# Altium footprint library 6-Connectors-6.PcbLib: 117 footprints (part 4 of 8)
Each footprint in its own frame and in the unit in brackets; x right, y up, seen from the top. Pads: shape width x height; smd on the part's side, far side on the other; paste and mask are expansions set on the pad; w line width, h text height; cw(c..) or ccw(c..) is an arc to the next point about the centre after c.
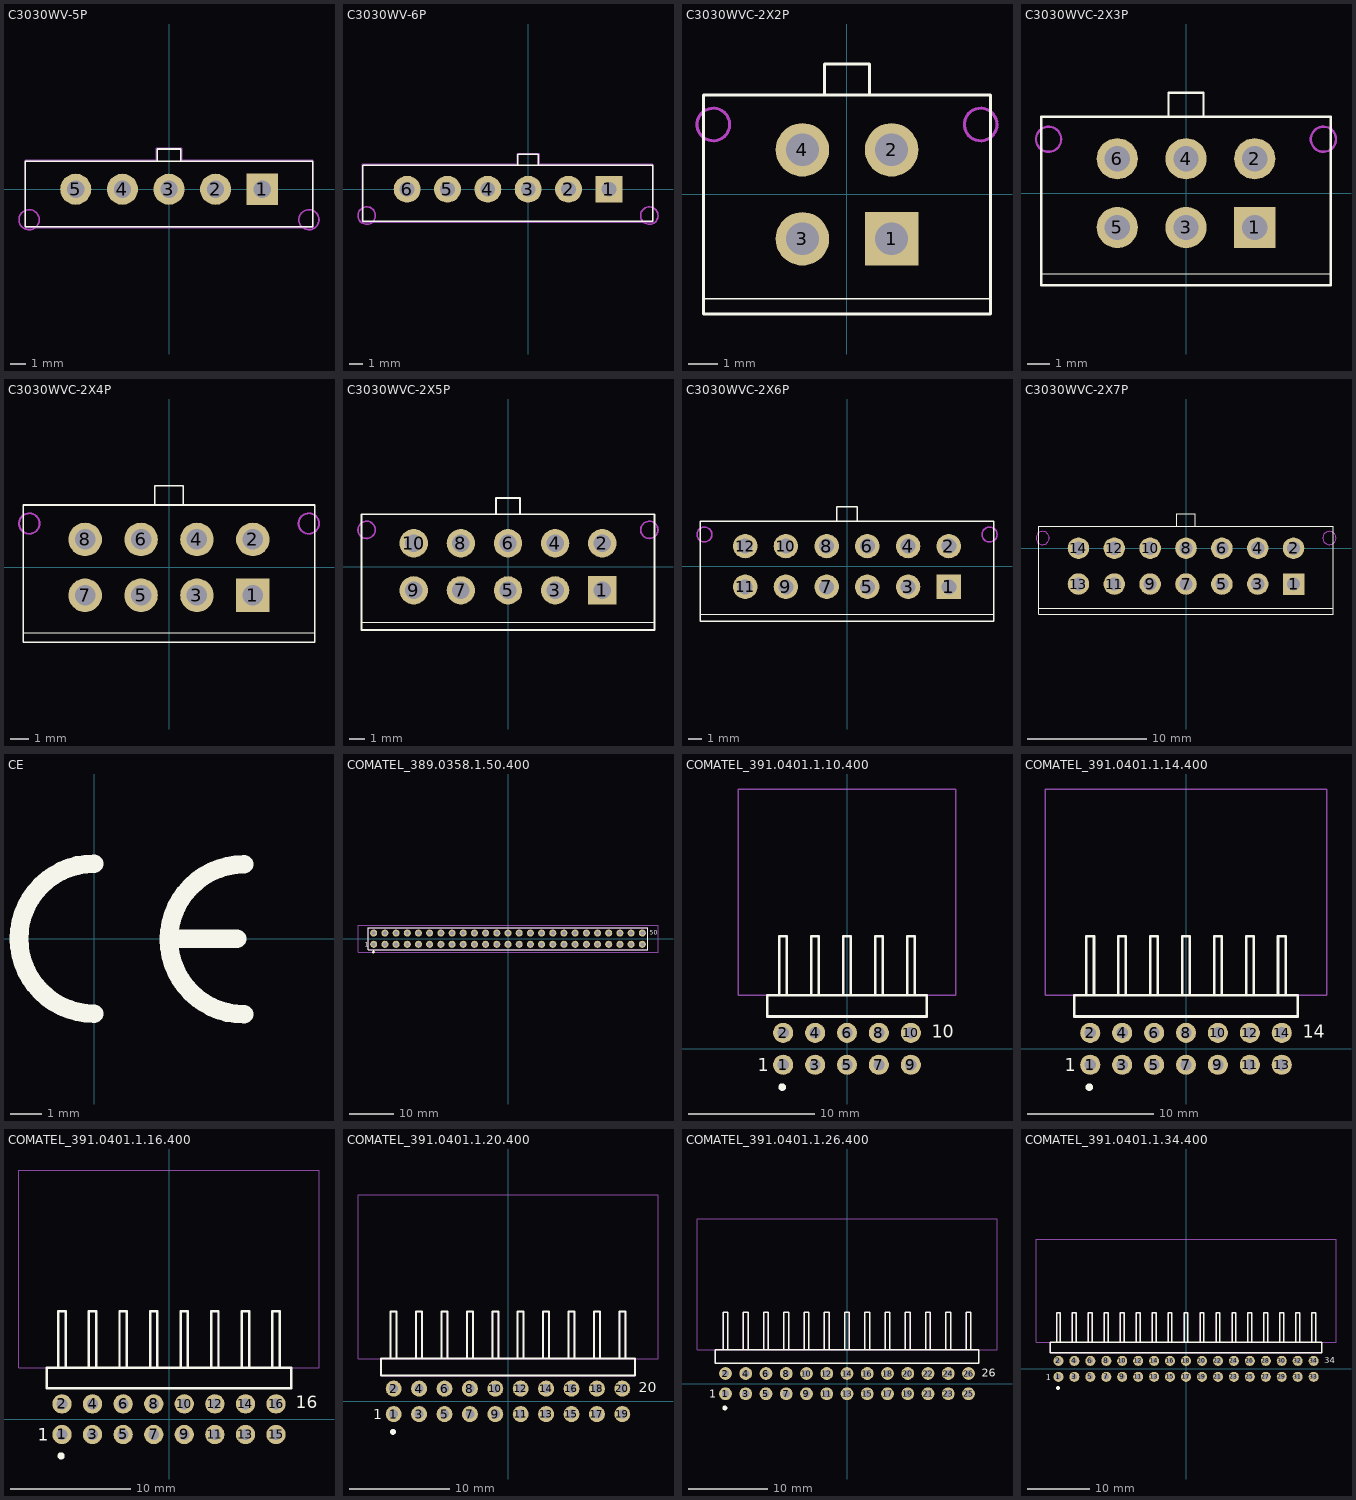
[diagram p3: the footprints below, top view; thin cyan lines are the x and y axes]

## C3030WV-5P [mm]
height 14.6
pads (5):
  rect 2x2 hole 1.1: 1(6,0)
  round 2 hole 1.1: 2(3,0) 3(0,0) 4(-3,0) 5(-6,0)
Top Overlay:
  lines w0.1: -0.762,1.79 -0.762,2.591 0.762,2.591 0.762,1.79 ; -9.25,-2.4 -9.25,1.79 9.25,1.79 9.25,-2.4 -9.25,-2.4
Keep-Out Layer:
  circle w0.1: c-9,-1.96 r0.65
  circle w0.1: c9,-1.96 r0.65
Mechanical 1:
  circle w0.1: c-9,-1.96 r0.65
  circle w0.1: c9,-1.96 r0.65
Mechanical 11:
  lines w0.1: -9.25,-2.464 9.25,-2.464 9.25,1.854 0.813,1.854 0.813,2.642 -0.813,2.642 -0.813,1.854 -9.25,1.854 -9.25,-2.464
3D body "2-2-1f.stp": height 0.35, standoff -1.85, extent 5,-1 7,1
3D body "2-2-1f.stp": height 0.35, standoff -1.85, extent 2,-1 4,1
3D body "2-2_1.stp": height 0.35, standoff -1.85, extent -1,-0.999 1,0.999
3D body "2-2_1.stp": height 0.35, standoff -1.85, extent -4,-0.999 -2,0.999
3D body "2-2_1.stp": height 0.35, standoff -1.85, extent -7,-0.999 -5,0.999
3D body "c3030wv-5p.stp": height 9.9, standoff -3, extent -9.35,-2.566 9.3,2.804

## C3030WV-6P [mm]
height 14.6
pads (6):
  rect 2x2 hole 1.1: 1(6,0)
  round 2 hole 1.1: 2(3,0) 3(0,0) 4(-3,0) 5(-6,0) 6(-9,0)
Top Overlay:
  lines w0.1: -0.762,1.79 -0.762,2.591 0.762,2.591 0.762,1.79 ; -12.294,-2.4 9.25,-2.4 9.25,1.79 -12.294,1.79 -12.294,-2.4
Keep-Out Layer:
  circle w0.1: c9,-1.96 r0.65
  circle w0.1: c-12,-1.96 r0.65
Mechanical 1:
  circle w0.1: c9,-1.96 r0.65
  circle w0.1: c-12,-1.96 r0.65
Mechanical 11:
  lines w0.1: -12.319,-2.464 -12.319,1.854 -0.813,1.854 -0.813,2.642 0.813,2.642 0.813,1.854 9.25,1.854 9.25,-2.464 -12.319,-2.464
3D body "2-2_1.stp": height 0.05, standoff -2.15, extent -9.98,-0.923 -7.98,1.075
3D body "2-2_1.stp": height 0.05, standoff -2.15, extent 5,-0.999 7,0.999
3D body "2-2_1.stp": height 0.05, standoff -2.15, extent -7,-0.999 -5,0.999
3D body "2-2_1.stp": height 0.05, standoff -2.15, extent -4,-0.999 -2,0.999
3D body "2-2_1.stp": height 0.05, standoff -2.15, extent -1,-0.999 1,0.999
3D body "2-2-1f.stp": height 0.05, standoff -2.15, extent 2,-1 4,1

## C3030WVC-2X2P [mm]
height 14.6
pads (4):
  rect 1.8x1.8 hole 1.1: 1(1.5,-1.5)
  round 1.8 hole 1.1: 2(1.5,1.5) 3(-1.5,-1.5) 4(-1.5,1.5)
Top Overlay:
  lines w0.05: -4.825,-3.513 4.825,-3.513
  lines w0.1: -0.762,3.337 -0.762,4.382 0.762,4.382 0.762,3.366 ; -4.825,-4.023 -4.825,-3.513 -4.825,3.337 4.825,3.337 4.825,-3.513 4.825,-4.023 -4.825,-4.023
Keep-Out Layer:
  circle w0.1: c-4.5,2.352 r0.55
  circle w0.1: c4.5,2.352 r0.55
Mechanical 1:
  circle w0.1: c-4.5,2.352 r0.55
  circle w0.1: c4.5,2.352 r0.55
3D body "c3030wv-2x2p.stp": height 9.9, standoff -3, extent -4.876,-3.985 4.774,3.375

## C3030WVC-2X3P [mm]
height 14.6
pads (6):
  rect 1.8x1.8 hole 1.1: 1(3,-1.5)
  round 1.8 hole 1.1: 2(3,1.5) 3(0,-1.5) 4(0,1.5) 5(-3,-1.5) 6(-3,1.5)
Top Overlay:
  lines w0.05: -6.325,-3.513 6.325,-3.513
  lines w0.1: -0.762,3.337 -0.762,4.382 0.762,4.382 0.762,3.366 ; -6.325,-4.023 -6.325,-3.513 -6.325,3.337 6.325,3.337 6.325,-3.513 6.325,-4.023 -6.325,-4.023
Keep-Out Layer:
  circle w0.1: c-6,2.352 r0.55
  circle w0.1: c6,2.352 r0.55
Mechanical 1:
  circle w0.1: c-6,2.352 r0.55
  circle w0.1: c6,2.352 r0.55
3D body "2-2-1f.stp": height 0.35, standoff -1.85, extent -4,-2.5 -2,-0.5
3D body "c3030wv-2x3p.stp": height 9.9, standoff -3, extent -6.325,-4.061 6.325,4.299
3D body "2-2_1.stp": height 0.35, standoff -1.85, extent -4,0.501 -2,2.499
3D body "2-2_1.stp": height 0.35, standoff -1.85, extent -1,0.501 1,2.499
3D body "2-2_1.stp": height 0.35, standoff -1.85, extent 2,0.501 4,2.499
3D body "2-2_1.stp": height 0.35, standoff -1.85, extent -1,-2.499 1,-0.501
3D body "2-2_1.stp": height 0.35, standoff -1.85, extent 2,-2.499 4,-0.501

## C3030WVC-2X4P [mm]
height 14.6
pads (8):
  rect 1.8x1.8 hole 1.1: 1(4.5,-1.5)
  round 1.8 hole 1.1: 2(4.5,1.5) 3(1.5,-1.5) 4(1.5,1.5) 5(-1.5,-1.5) 6(-1.5,1.5) 7(-4.5,-1.5) 8(-4.5,1.5)
Top Overlay:
  lines w0.05: -7.825,-3.513 7.825,-3.513
  lines w0.1: -0.762,3.337 -0.762,4.382 0.762,4.382 0.762,3.366 ; -7.825,-4.023 -7.825,-3.513 -7.825,3.337 7.825,3.337 7.825,-3.513 7.825,-4.023 -7.825,-4.023
Keep-Out Layer:
  circle w0.1: c-7.5,2.352 r0.55
  circle w0.1: c7.5,2.352 r0.55
Mechanical 1:
  circle w0.1: c-7.5,2.352 r0.55
  circle w0.1: c7.5,2.352 r0.55

## C3030WVC-2X5P [mm]
height 14.6
pads (10):
  rect 1.8x1.8 hole 1.1: 1(6,-1.5)
  round 1.8 hole 1.1: 2(6,1.5) 3(3,-1.5) 4(3,1.5) 5(0,-1.5) 6(0,1.5) 7(-3,-1.5) 8(-3,1.5) 9(-6,-1.5) 10(-6,1.5)
Top Overlay:
  lines w0.05: -9.325,-3.513 9.325,-3.513
  lines w0.1: -0.762,3.337 -0.762,4.382 0.762,4.382 0.762,3.366 ; -9.325,-4.023 -9.325,-3.513 -9.325,3.337 9.325,3.337 9.325,-3.513 9.325,-4.023 -9.325,-4.023
Keep-Out Layer:
  circle w0.1: c-9,2.352 r0.55
  circle w0.1: c9,2.352 r0.55
Mechanical 1:
  circle w0.1: c-9,2.352 r0.55
  circle w0.1: c9,2.352 r0.55
3D body "c3030wv-2x5p.stp": height 9.9, standoff -3, extent -9.329,-3.985 9.329,4.375
3D body "2-2_1.stp": height 0.35, standoff -1.85, extent -7,0.501 -5,2.499
3D body "2-2_1.stp": height 0.35, standoff -1.85, extent -4,0.501 -2,2.499
3D body "2-2_1.stp": height 0.35, standoff -1.85, extent -4,-2.499 -2,-0.501
3D body "2-2_1.stp": height 0.35, standoff -1.85, extent -1,0.501 1,2.499
3D body "2-2_1.stp": height 0.35, standoff -1.85, extent -1,-2.499 1,-0.501
3D body "2-2_1.stp": height 0.35, standoff -1.85, extent 2,-2.499 4,-0.501
3D body "2-2_1.stp": height 0.35, standoff -1.85, extent 5,-2.499 7,-0.501
3D body "2-2_1.stp": height 0.35, standoff -1.85, extent 5,0.501 7,2.499
3D body "2-2_1.stp": height 0.35, standoff -1.85, extent 2,0.501 4,2.499
3D body "2-2-1f.stp": height 0.35, standoff -1.85, extent -7,-2.5 -5,-0.5

## C3030WVC-2X6P [mm]
height 14.6
pads (12):
  rect 1.8x1.8 hole 1.1: 1(7.5,-1.5)
  round 1.8 hole 1.1: 2(7.5,1.5) 3(4.5,-1.5) 4(4.5,1.5) 5(1.5,-1.5) 6(1.5,1.5) 7(-1.5,-1.5) 8(-1.5,1.5) 9(-4.5,-1.5) 10(-4.5,1.5) 11(-7.5,-1.5) 12(-7.5,1.5)
Top Overlay:
  lines w0.05: -10.825,-3.513 10.825,-3.513
  lines w0.1: -0.762,3.337 -0.762,4.382 0.762,4.382 0.762,3.366 ; -10.825,-4.023 10.825,-4.023 10.825,-3.513 10.825,3.337 -10.825,3.337 -10.825,-3.513 -10.825,-4.023
Keep-Out Layer:
  circle w0.1: c10.5,2.352 r0.55
  circle w0.1: c-10.5,2.352 r0.55
Mechanical 1:
  circle w0.1: c10.5,2.352 r0.55
  circle w0.1: c-10.5,2.352 r0.55

## C3030WVC-2X7P [mm]
height 14.6
pads (14):
  rect 1.8x1.8 hole 1.1: 1(9,-3)
  round 1.8 hole 1.1: 2(9,0) 3(6,-3) 4(6,0) 5(3,-3) 6(3,0) 7(0,-3) 8(0,0) 9(-3,-3) 10(-3,0) 11(-6,-3) 12(-6,0) 13(-9,-3) 14(-9,0)
Top Overlay:
  lines w0.05: -12.325,-5.013 12.325,-5.013
  lines w0.1: -0.762,1.837 -0.762,2.882 0.762,2.882 0.762,1.866 ; -12.325,-5.523 -12.325,-5.013 -12.325,1.837 12.325,1.837 12.325,-5.013 12.325,-5.523 -12.325,-5.523
Keep-Out Layer:
  circle w0.1: c-12,0.852 r0.55
  circle w0.1: c12,0.852 r0.55
Mechanical 1:
  circle w0.1: c-12,0.852 r0.55
  circle w0.1: c12,0.852 r0.55

## CE [mm]
Top Overlay:
  lines w0.6: 0,-2.413 cw(c0,0) 0,2.413 ; 2.53,0 4.6,0 ; 4.826,-2.438 cw(c4.826,-0.025) 4.826,2.388
3D body "ce.stp": height 0.02, standoff 0, extent -2.725,-2.725 4.82,2.725

## COMATEL_389.0358.1.50.400 [mm] "50 Contacts - Pitch 2.54mm - Dual Row Straight Strip Header - Insulator 1.7mm"
height 8
pads (50):
  round 1.6 hole 0.9: 1(-30.48,-1.27) 2(-30.48,1.27) 3(-27.94,-1.27) 4(-27.94,1.27) 5(-25.4,-1.27) 6(-25.4,1.27) 7(-22.86,-1.27) 8(-22.86,1.27) 9(-20.32,-1.27) 10(-20.32,1.27) 11(-17.78,-1.27) 12(-17.78,1.27) 13(-15.24,-1.27) 14(-15.24,1.27) 15(-12.7,-1.27) 16(-12.7,1.27) 17(-10.16,-1.27) 18(-10.16,1.27) 19(-7.62,-1.27) 20(-7.62,1.27) 21(-5.08,-1.27) 22(-5.08,1.27) 23(-2.54,-1.27) 24(-2.54,1.27) 25(0,-1.27) 26(0,1.27) 27(2.54,-1.27) 28(2.54,1.27) 29(5.08,-1.27) 30(5.08,1.27) 31(7.62,-1.27) 32(7.62,1.27) 33(10.16,-1.27) 34(10.16,1.27) 35(12.7,-1.27) 36(12.7,1.27) 37(15.24,-1.27) 38(15.24,1.27) 39(17.78,-1.27) 40(17.78,1.27) 41(20.32,-1.27) 42(20.32,1.27) 43(22.86,-1.27) 44(22.86,1.27) 45(25.4,-1.27) 46(25.4,1.27) 47(27.94,-1.27) 48(27.94,1.27) 49(30.48,-1.27) 50(30.48,1.27)
Top Overlay:
  circle w0.3: c-30.553,-3.048 r0.15
  lines w0.2: -31.75,-2.5 -31.75,2.5 31.75,2.5 31.75,-2.5 -31.75,-2.5
  text "50" at 32.131,0.889 h1.02
  text "1" at -32.512,-1.778 h1.02
Mechanical 8:
  lines w0.1: -34.04,-3.05 -34.04,3.05 34.04,3.05 34.04,-3.05 -34.04,-3.05
Mechanical 14:
  lines w0.1: 31.75,-2.5 31.75,2.5 ; 31.75,-2.5 -31.75,-2.5 -31.75,2.5 31.75,2.5 ; 31.75,-2.5 31.75,2.5
3D body "COMATEL_389.0358.1.50.400.stp": height 8, standoff -3.2, extent -31.75,-3 31.75,2.5

## COMATEL_391.0401.1.10.400 [mm] "10 Contacts - Pitch 2.54mm - Dual Row Right Angle Strip Header - Insulator 1.7mm"
height 8
pads (10):
  round 1.6 hole 0.9: 1(-5.08,-1.27) 2(-5.08,1.27) 3(-2.54,-1.27) 4(-2.54,1.27) 5(0,-1.27) 6(0,1.27) 7(2.54,-1.27) 8(2.54,1.27) 9(5.08,-1.27) 10(5.08,1.27)
Top Overlay:
  circle w0.3: c-5.153,-3.048 r0.15
  lines w0.2: -6.35,2.57 -6.35,4.27 6.35,4.27 6.35,2.57 -6.35,2.57 ; -5.38,4.27 -4.78,4.27 -4.78,8.97 -5.38,8.97 -5.38,4.27 ; -2.84,4.27 -2.84,8.97 -2.24,8.97 -2.24,4.27 -2.84,4.27 ; -0.3,4.27 -0.3,8.97 0.3,8.97 0.3,4.27 -0.3,4.27 ; 2.24,4.27 2.24,8.97 2.84,8.97 2.84,4.27 2.24,4.27 ; 4.78,4.27 4.78,8.97 5.38,8.97 5.38,4.27 4.78,4.27
  text "1" at -7.112,-1.778 h1.02
  text "10" at 6.731,0.889 h1.02
Mechanical 8:
  lines w0.1: -8.65,4.27 8.65,4.27 8.65,20.67 -8.65,20.67 -8.65,4.27
Mechanical 14:
  lines w0.1: -6.35,2.57 6.35,2.57 6.35,4.27 -6.35,4.27 -6.35,2.57 ; -5.38,4.27 -4.78,4.27 -4.78,8.97 -5.38,8.97 -5.38,4.27 ; -2.84,4.27 -2.84,8.97 -2.24,8.97 -2.24,4.27 -2.84,4.27 ; -0.3,4.27 -0.3,8.97 0.3,8.97 0.3,4.27 -0.3,4.27 ; 2.24,4.27 2.24,8.97 2.84,8.97 2.84,4.27 2.24,4.27 ; 4.78,4.27 4.78,8.97 5.38,8.97 5.38,4.27 4.78,4.27
  text "1" at -7.112,-1.778 h1.02
  text "10" at 6.731,0.889 h1.02
3D body "COMATEL_391.0401.1.10.400.stp": height 5.57, standoff -4.3, extent -6.35,-1.57 6.35,10.27
3D body "v160-090.stp": height 0.02, standoff -1.65, extent -5.88,-2.07 -4.28,-0.47
3D body "v160-090.stp": height 0.02, standoff -1.65, extent -5.88,0.47 -4.28,2.07
3D body "v160-090.stp": height 0.02, standoff -1.65, extent -3.34,0.47 -1.74,2.07
3D body "v160-090.stp": height 0.02, standoff -1.65, extent -3.34,-2.07 -1.74,-0.47
3D body "v160-090.stp": height 0.02, standoff -1.65, extent -0.8,-2.07 0.8,-0.47
3D body "v160-090.stp": height 0.02, standoff -1.65, extent -0.8,0.47 0.8,2.07
3D body "v160-090.stp": height 0.02, standoff -1.65, extent 1.74,-2.07 3.34,-0.47
3D body "v160-090.stp": height 0.02, standoff -1.65, extent 1.74,0.47 3.34,2.07
3D body "v160-090.stp": height 0.02, standoff -1.65, extent 4.28,0.47 5.88,2.07
3D body "v160-090.stp": height 0.02, standoff -1.65, extent 4.28,-2.07 5.88,-0.47

## COMATEL_391.0401.1.14.400 [mm] "14 Contacts - Pitch 2.54mm - Dual Row Right Angle Strip Header - Insulator 1.7mm"
height 8
pads (14):
  round 1.6 hole 0.9: 1(-7.62,-1.27) 2(-7.62,1.27) 3(-5.08,-1.27) 4(-5.08,1.27) 5(-2.54,-1.27) 6(-2.54,1.27) 7(0,-1.27) 8(0,1.27) 9(2.54,-1.27) 10(2.54,1.27) 11(5.08,-1.27) 12(5.08,1.27) 13(7.62,-1.27) 14(7.62,1.27)
Top Overlay:
  circle w0.3: c-7.693,-3.048 r0.15
  lines w0.2: -7.92,4.27 -7.32,4.27 ; -7.92,4.27 -7.92,8.97 -7.32,8.97 -7.32,4.27 ; -7.92,4.27 -7.32,4.27 ; -5.38,4.27 -4.78,4.27 ; -5.38,4.27 -5.38,8.97 -4.78,8.97 -4.78,4.27 ; -5.38,4.27 -4.78,4.27 ; -2.84,4.27 -2.24,4.27 ; -2.84,4.27 -2.84,8.97 -2.24,8.97 -2.24,4.27 ; -2.84,4.27 -2.24,4.27 ; -0.3,4.27 0.3,4.27 ; -0.3,4.27 -0.3,8.97 0.3,8.97 0.3,4.27 ; -0.3,4.27 0.3,4.27 ; 2.24,4.27 2.84,4.27 ; 2.24,4.27 2.24,8.97 2.84,8.97 2.84,4.27 ; 2.24,4.27 2.84,4.27 ; -8.89,2.57 8.89,2.57 8.89,4.27 -8.89,4.27 -8.89,2.57 ; 4.78,4.27 4.78,8.97 5.38,8.97 5.38,4.27 4.78,4.27 ; 7.32,4.27 7.32,8.97 7.92,8.97 7.92,4.27 7.32,4.27
  text "14" at 9.271,0.889 h1.02
  text "1" at -9.652,-1.778 h1.02
Mechanical 8:
  lines w0.1: -11.19,4.27 -11.19,20.67 11.19,20.67 11.19,4.27 -11.19,4.27
Mechanical 14:
  lines w0.1: -7.92,4.27 -7.32,4.27 ; -7.92,4.27 -7.92,8.97 -7.32,8.97 -7.32,4.27 ; -7.92,4.27 -7.32,4.27 ; -5.38,4.27 -4.78,4.27 ; -5.38,4.27 -5.38,8.97 -4.78,8.97 -4.78,4.27 ; -5.38,4.27 -4.78,4.27 ; -2.84,4.27 -2.24,4.27 ; -2.84,4.27 -2.84,8.97 -2.24,8.97 -2.24,4.27 ; -2.84,4.27 -2.24,4.27 ; -0.3,4.27 0.3,4.27 ; -0.3,4.27 -0.3,8.97 0.3,8.97 0.3,4.27 ; -0.3,4.27 0.3,4.27 ; 2.24,4.27 2.84,4.27 ; 2.24,4.27 2.24,8.97 2.84,8.97 2.84,4.27 ; 2.24,4.27 2.84,4.27 ; -8.89,2.57 -8.89,4.27 8.89,4.27 8.89,2.57 -8.89,2.57 ; 4.78,4.27 4.78,8.97 5.38,8.97 5.38,4.27 4.78,4.27 ; 7.32,4.27 7.32,8.97 7.92,8.97 7.92,4.27 7.32,4.27
  text "14" at 9.271,0.889 h1.02
  text "1" at -9.652,-1.778 h1.02
3D body "COMATEL_391.0401.1.14.400.stp": height 5.57, standoff -4.3, extent -8.89,-1.57 8.89,10.27
3D body "v160-090.stp": height 0.02, standoff -1.65, extent -8.42,0.47 -6.82,2.07
3D body "v160-090.stp": height 0.02, standoff -1.65, extent -8.42,-2.07 -6.82,-0.47
3D body "v160-090.stp": height 0.02, standoff -1.65, extent -5.88,0.47 -4.28,2.07
3D body "v160-090.stp": height 0.02, standoff -1.65, extent -5.88,-2.07 -4.28,-0.47
3D body "v160-090.stp": height 0.02, standoff -1.65, extent -3.34,0.47 -1.74,2.07
3D body "v160-090.stp": height 0.02, standoff -1.65, extent -3.34,-2.07 -1.74,-0.47
3D body "v160-090.stp": height 0.02, standoff -1.65, extent -0.8,0.47 0.8,2.07
3D body "v160-090.stp": height 0.02, standoff -1.65, extent -0.8,-2.07 0.8,-0.47
3D body "v160-090.stp": height 0.02, standoff -1.65, extent 1.74,0.47 3.34,2.07
3D body "v160-090.stp": height 0.02, standoff -1.65, extent 1.74,-2.07 3.34,-0.47
3D body "v160-090.stp": height 0.02, standoff -1.65, extent 4.28,0.47 5.88,2.07
3D body "v160-090.stp": height 0.02, standoff -1.65, extent 4.28,-2.07 5.88,-0.47
3D body "v160-090.stp": height 0.02, standoff -1.65, extent 6.82,-2.07 8.42,-0.47
3D body "v160-090.stp": height 0.02, standoff -1.65, extent 6.82,0.47 8.42,2.07

## COMATEL_391.0401.1.16.400 [mm] "16 Contacts - Pitch 2.54mm - Dual Row Right Angle Strip Header - Insulator 1.7mm"
height 8
pads (16):
  round 1.6 hole 0.9: 1(-8.89,-1.27) 2(-8.89,1.27) 3(-6.35,-1.27) 4(-6.35,1.27) 5(-3.81,-1.27) 6(-3.81,1.27) 7(-1.27,-1.27) 8(-1.27,1.27) 9(1.27,-1.27) 10(1.27,1.27) 11(3.81,-1.27) 12(3.81,1.27) 13(6.35,-1.27) 14(6.35,1.27) 15(8.89,-1.27) 16(8.89,1.27)
Top Overlay:
  circle w0.3: c-8.963,-3.048 r0.15
  lines w0.2: -9.19,4.27 -8.59,4.27 ; -9.19,4.27 -9.19,8.97 -8.59,8.97 -8.59,4.27 ; -9.19,4.27 -8.59,4.27 ; -6.65,4.27 -6.05,4.27 ; -6.65,4.27 -6.65,8.97 -6.05,8.97 -6.05,4.27 ; -6.65,4.27 -6.05,4.27 ; -4.11,4.27 -3.51,4.27 ; -4.11,4.27 -4.11,8.97 -3.51,8.97 -3.51,4.27 ; -4.11,4.27 -3.51,4.27 ; -1.57,4.27 -0.97,4.27 ; -1.57,4.27 -1.57,8.97 -0.97,8.97 -0.97,4.27 ; -1.57,4.27 -0.97,4.27 ; 0.97,4.27 1.57,4.27 ; 0.97,4.27 0.97,8.97 1.57,8.97 1.57,4.27 ; 0.97,4.27 1.57,4.27 ; -10.16,2.57 -10.16,4.27 10.16,4.27 10.16,2.57 -10.16,2.57 ; 3.51,4.27 4.11,4.27 4.11,8.97 3.51,8.97 3.51,4.27 ; 6.05,4.27 6.65,4.27 6.65,8.97 6.05,8.97 6.05,4.27 ; 8.59,4.27 8.59,8.97 9.19,8.97 9.19,4.27 8.59,4.27
  text "1" at -10.922,-1.778 h1.02
  text "16" at 10.541,0.889 h1.02
Mechanical 8:
  lines w0.1: -12.46,4.27 -12.46,20.67 12.46,20.67 12.46,4.27 -12.46,4.27
Mechanical 14:
  lines w0.1: -9.19,4.27 -8.59,4.27 ; -9.19,4.27 -9.19,8.97 -8.59,8.97 -8.59,4.27 ; -9.19,4.27 -8.59,4.27 ; -6.65,4.27 -6.05,4.27 ; -6.65,4.27 -6.65,8.97 -6.05,8.97 -6.05,4.27 ; -6.65,4.27 -6.05,4.27 ; -4.11,4.27 -3.51,4.27 ; -4.11,4.27 -4.11,8.97 -3.51,8.97 -3.51,4.27 ; -4.11,4.27 -3.51,4.27 ; -1.57,4.27 -0.97,4.27 ; -1.57,4.27 -1.57,8.97 -0.97,8.97 -0.97,4.27 ; -1.57,4.27 -0.97,4.27 ; 0.97,4.27 1.57,4.27 ; 0.97,4.27 0.97,8.97 1.57,8.97 1.57,4.27 ; 0.97,4.27 1.57,4.27 ; -10.16,2.57 10.16,2.57 10.16,4.27 -10.16,4.27 -10.16,2.57 ; 3.51,4.27 4.11,4.27 4.11,8.97 3.51,8.97 3.51,4.27 ; 6.05,4.27 6.65,4.27 6.65,8.97 6.05,8.97 6.05,4.27 ; 8.59,4.27 8.59,8.97 9.19,8.97 9.19,4.27 8.59,4.27
  text "1" at -10.922,-1.778 h1.02
  text "16" at 10.541,0.889 h1.02
3D body "COMATEL_391.0401.1.16.400.stp": height 5.57, standoff -4.3, extent -10.16,-1.57 10.16,10.27
3D body "v160-090.stp": height 0.02, standoff -1.65, extent -9.69,0.47 -8.09,2.07
3D body "v160-090.stp": height 0.02, standoff -1.65, extent -9.69,-2.07 -8.09,-0.47
3D body "v160-090.stp": height 0.02, standoff -1.65, extent -7.15,0.47 -5.55,2.07
3D body "v160-090.stp": height 0.02, standoff -1.65, extent -7.15,-2.07 -5.55,-0.47
3D body "v160-090.stp": height 0.02, standoff -1.65, extent -4.61,-2.07 -3.01,-0.47
3D body "v160-090.stp": height 0.02, standoff -1.65, extent -4.61,0.47 -3.01,2.07
3D body "v160-090.stp": height 0.02, standoff -1.65, extent -2.07,-2.07 -0.47,-0.47
3D body "v160-090.stp": height 0.02, standoff -1.65, extent -2.07,0.47 -0.47,2.07
3D body "v160-090.stp": height 0.02, standoff -1.65, extent 0.47,0.47 2.07,2.07
3D body "v160-090.stp": height 0.02, standoff -1.65, extent 0.47,-2.07 2.07,-0.47
3D body "v160-090.stp": height 0.02, standoff -1.65, extent 3.01,-2.07 4.61,-0.47
3D body "v160-090.stp": height 0.02, standoff -1.65, extent 3.01,0.47 4.61,2.07
3D body "v160-090.stp": height 0.02, standoff -1.65, extent 5.55,0.47 7.15,2.07
3D body "v160-090.stp": height 0.02, standoff -1.65, extent 5.55,-2.07 7.15,-0.47
3D body "v160-090.stp": height 0.02, standoff -1.65, extent 8.09,-2.07 9.69,-0.47
3D body "v160-090.stp": height 0.02, standoff -1.65, extent 8.09,0.47 9.69,2.07

## COMATEL_391.0401.1.20.400 [mm] "20 Contacts - Pitch 2.54mm - Dual Row Right Angle Strip Header - Insulator 1.7mm"
height 8
pads (20):
  round 1.6 hole 0.9: 1(-11.43,-1.27) 2(-11.43,1.27) 3(-8.89,-1.27) 4(-8.89,1.27) 5(-6.35,-1.27) 6(-6.35,1.27) 7(-3.81,-1.27) 8(-3.81,1.27) 9(-1.27,-1.27) 10(-1.27,1.27) 11(1.27,-1.27) 12(1.27,1.27) 13(3.81,-1.27) 14(3.81,1.27) 15(6.35,-1.27) 16(6.35,1.27) 17(8.89,-1.27) 18(8.89,1.27) 19(11.43,-1.27) 20(11.43,1.27)
Top Overlay:
  circle w0.3: c-11.503,-3.048 r0.15
  lines w0.2: -11.73,4.27 -11.13,4.27 ; -11.73,4.27 -11.73,8.97 -11.13,8.97 -11.13,4.27 ; -11.73,4.27 -11.13,4.27 ; -9.19,4.27 -8.59,4.27 ; -9.19,4.27 -9.19,8.97 -8.59,8.97 -8.59,4.27 ; -9.19,4.27 -8.59,4.27 ; -6.65,4.27 -6.05,4.27 ; -6.65,4.27 -6.65,8.97 -6.05,8.97 -6.05,4.27 ; -6.65,4.27 -6.05,4.27 ; -4.11,4.27 -3.51,4.27 ; -4.11,4.27 -4.11,8.97 -3.51,8.97 -3.51,4.27 ; -4.11,4.27 -3.51,4.27 ; -1.57,4.27 -0.97,4.27 ; -1.57,4.27 -1.57,8.97 -0.97,8.97 -0.97,4.27 ; -1.57,4.27 -0.97,4.27 ; 0.97,4.27 1.57,4.27 ; 0.97,4.27 0.97,8.97 1.57,8.97 1.57,4.27 ; 0.97,4.27 1.57,4.27 ; 3.51,4.27 4.11,4.27 ; 3.51,4.27 3.51,8.97 4.11,8.97 4.11,4.27 ; 3.51,4.27 4.11,4.27 ; 6.05,4.27 6.65,4.27 ; 6.05,4.27 6.05,8.97 6.65,8.97 6.65,4.27 ; 6.05,4.27 6.65,4.27 ; 8.59,4.27 9.19,4.27 ; 8.59,4.27 8.59,8.97 9.19,8.97 9.19,4.27 ; 8.59,4.27 9.19,4.27 ; 11.13,4.27 11.73,4.27 ; 11.13,4.27 11.13,8.97 11.73,8.97 11.73,4.27 ; 11.13,4.27 11.73,4.27 ; -12.7,2.57 -12.7,4.27 12.7,4.27 12.7,2.57 -12.7,2.57
  text "20" at 13.081,0.889 h1.02
  text "1" at -13.462,-1.778 h1.02
Mechanical 8:
  lines w0.1: -15,4.27 -15,20.67 15,20.67 15,4.27 -15,4.27
Mechanical 14:
  lines w0.1: -11.73,4.27 -11.13,4.27 ; -11.73,4.27 -11.73,8.97 -11.13,8.97 -11.13,4.27 ; -11.73,4.27 -11.13,4.27 ; -9.19,4.27 -8.59,4.27 ; -9.19,4.27 -9.19,8.97 -8.59,8.97 -8.59,4.27 ; -9.19,4.27 -8.59,4.27 ; -6.65,4.27 -6.05,4.27 ; -6.65,4.27 -6.65,8.97 -6.05,8.97 -6.05,4.27 ; -6.65,4.27 -6.05,4.27 ; -4.11,4.27 -3.51,4.27 ; -4.11,4.27 -4.11,8.97 -3.51,8.97 -3.51,4.27 ; -4.11,4.27 -3.51,4.27 ; -1.57,4.27 -0.97,4.27 ; -1.57,4.27 -1.57,8.97 -0.97,8.97 -0.97,4.27 ; -1.57,4.27 -0.97,4.27 ; 0.97,4.27 1.57,4.27 ; 0.97,4.27 0.97,8.97 1.57,8.97 1.57,4.27 ; 0.97,4.27 1.57,4.27 ; 3.51,4.27 4.11,4.27 ; 3.51,4.27 3.51,8.97 4.11,8.97 4.11,4.27 ; 3.51,4.27 4.11,4.27 ; 6.05,4.27 6.65,4.27 ; 6.05,4.27 6.05,8.97 6.65,8.97 6.65,4.27 ; 6.05,4.27 6.65,4.27 ; 8.59,4.27 9.19,4.27 ; 8.59,4.27 8.59,8.97 9.19,8.97 9.19,4.27 ; 8.59,4.27 9.19,4.27 ; 11.13,4.27 11.73,4.27 ; 11.13,4.27 11.13,8.97 11.73,8.97 11.73,4.27 ; 11.13,4.27 11.73,4.27 ; -12.7,2.57 12.7,2.57 12.7,4.27 -12.7,4.27 -12.7,2.57
  text "20" at 13.081,0.889 h1.02
  text "1" at -13.462,-1.778 h1.02
3D body "COMATEL_391.0401.1.20.400.stp": height 5.57, standoff -4.3, extent -12.7,-1.57 12.7,10.27
3D body "v160-090.stp": height 0.02, standoff -1.65, extent -12.23,0.47 -10.63,2.07
3D body "v160-090.stp": height 0.02, standoff -1.65, extent -12.23,-2.07 -10.63,-0.47
3D body "v160-090.stp": height 0.02, standoff -1.65, extent -9.69,0.47 -8.09,2.07
3D body "v160-090.stp": height 0.02, standoff -1.65, extent -9.69,-2.07 -8.09,-0.47
3D body "v160-090.stp": height 0.02, standoff -1.65, extent -7.15,0.47 -5.55,2.07
3D body "v160-090.stp": height 0.02, standoff -1.65, extent -7.15,-2.07 -5.55,-0.47
3D body "v160-090.stp": height 0.02, standoff -1.65, extent -4.61,-2.07 -3.01,-0.47
3D body "v160-090.stp": height 0.02, standoff -1.65, extent -4.61,0.47 -3.01,2.07
3D body "v160-090.stp": height 0.02, standoff -1.65, extent -2.07,0.47 -0.47,2.07
3D body "v160-090.stp": height 0.02, standoff -1.65, extent -2.07,-2.07 -0.47,-0.47
3D body "v160-090.stp": height 0.02, standoff -1.65, extent 0.47,-2.07 2.07,-0.47
3D body "v160-090.stp": height 0.02, standoff -1.65, extent 0.47,0.47 2.07,2.07
3D body "v160-090.stp": height 0.02, standoff -1.65, extent 3.01,0.47 4.61,2.07
3D body "v160-090.stp": height 0.02, standoff -1.65, extent 3.01,-2.07 4.61,-0.47
3D body "v160-090.stp": height 0.02, standoff -1.65, extent 5.55,-2.07 7.15,-0.47
3D body "v160-090.stp": height 0.02, standoff -1.65, extent 8.09,-2.07 9.69,-0.47
3D body "v160-090.stp": height 0.02, standoff -1.65, extent 8.09,0.47 9.69,2.07
3D body "v160-090.stp": height 0.02, standoff -1.65, extent 10.63,0.47 12.23,2.07
3D body "v160-090.stp": height 0.02, standoff -1.65, extent 10.63,-2.07 12.23,-0.47

## COMATEL_391.0401.1.26.400 [mm] "26 Contacts - Pitch 2.54mm - Dual Row Right Angle Strip Header - Insulator 1.7mm"
height 8
pads (26):
  round 1.6 hole 0.9: 1(-15.24,-1.27) 2(-15.24,1.27) 3(-12.7,-1.27) 4(-12.7,1.27) 5(-10.16,-1.27) 6(-10.16,1.27) 7(-7.62,-1.27) 8(-7.62,1.27) 9(-5.08,-1.27) 10(-5.08,1.27) 11(-2.54,-1.27) 12(-2.54,1.27) 13(0,-1.27) 14(0,1.27) 15(2.54,-1.27) 16(2.54,1.27) 17(5.08,-1.27) 18(5.08,1.27) 19(7.62,-1.27) 20(7.62,1.27) 21(10.16,-1.27) 22(10.16,1.27) 23(12.7,-1.27) 24(12.7,1.27) 25(15.24,-1.27) 26(15.24,1.27)
Top Overlay:
  circle w0.3: c-15.313,-3.048 r0.15
  lines w0.2: -15.54,4.27 -14.94,4.27 ; -15.54,4.27 -15.54,8.97 -14.94,8.97 -14.94,4.27 ; -15.54,4.27 -14.94,4.27 ; -13,4.27 -12.4,4.27 ; -13,4.27 -13,8.97 -12.4,8.97 -12.4,4.27 ; -13,4.27 -12.4,4.27 ; -10.46,4.27 -9.86,4.27 ; -10.46,4.27 -10.46,8.97 -9.86,8.97 -9.86,4.27 ; -10.46,4.27 -9.86,4.27 ; -7.92,4.27 -7.32,4.27 ; -7.92,4.27 -7.92,8.97 -7.32,8.97 -7.32,4.27 ; -7.92,4.27 -7.32,4.27 ; -5.38,4.27 -4.78,4.27 ; -5.38,4.27 -5.38,8.97 -4.78,8.97 -4.78,4.27 ; -5.38,4.27 -4.78,4.27 ; -2.84,4.27 -2.24,4.27 ; -2.84,4.27 -2.84,8.97 -2.24,8.97 -2.24,4.27 ; -2.84,4.27 -2.24,4.27 ; -0.3,4.27 0.3,4.27 ; -0.3,4.27 -0.3,8.97 0.3,8.97 0.3,4.27 ; -0.3,4.27 0.3,4.27 ; 2.24,4.27 2.84,4.27 ; 2.24,4.27 2.24,8.97 2.84,8.97 2.84,4.27 ; 2.24,4.27 2.84,4.27 ; 4.78,4.27 5.38,4.27 ; 4.78,4.27 4.78,8.97 5.38,8.97 5.38,4.27 ; 4.78,4.27 5.38,4.27 ; 7.32,4.27 7.92,4.27 ; 7.32,4.27 7.32,8.97 7.92,8.97 7.92,4.27 ; 7.32,4.27 7.92,4.27 ; 9.86,4.27 10.46,4.27 ; 9.86,4.27 9.86,8.97 10.46,8.97 10.46,4.27 ; 9.86,4.27 10.46,4.27 ; 12.4,4.27 13,4.27 ; 12.4,4.27 12.4,8.97 13,8.97 13,4.27 ; 12.4,4.27 13,4.27 ; 14.94,4.27 15.54,4.27 ; 14.94,4.27 14.94,8.97 15.54,8.97 15.54,4.27 ; 14.94,4.27 15.54,4.27 ; -16.51,2.57 16.51,2.57 16.51,4.27 -16.51,4.27 -16.51,2.57
  text "1" at -17.272,-1.778 h1.02
  text "26" at 16.891,0.889 h1.02
Mechanical 8:
  lines w0.1: -18.81,4.27 18.81,4.27 18.81,20.67 -18.81,20.67 -18.81,4.27
Mechanical 14:
  lines w0.1: -15.54,4.27 -14.94,4.27 ; -15.54,4.27 -15.54,8.97 -14.94,8.97 -14.94,4.27 ; -15.54,4.27 -14.94,4.27 ; -13,4.27 -12.4,4.27 ; -13,4.27 -13,8.97 -12.4,8.97 -12.4,4.27 ; -13,4.27 -12.4,4.27 ; -10.46,4.27 -9.86,4.27 ; -10.46,4.27 -10.46,8.97 -9.86,8.97 -9.86,4.27 ; -10.46,4.27 -9.86,4.27 ; -7.92,4.27 -7.32,4.27 ; -7.92,4.27 -7.92,8.97 -7.32,8.97 -7.32,4.27 ; -7.92,4.27 -7.32,4.27 ; -5.38,4.27 -4.78,4.27 ; -5.38,4.27 -5.38,8.97 -4.78,8.97 -4.78,4.27 ; -5.38,4.27 -4.78,4.27 ; -2.84,4.27 -2.24,4.27 ; -2.84,4.27 -2.84,8.97 -2.24,8.97 -2.24,4.27 ; -2.84,4.27 -2.24,4.27 ; -0.3,4.27 0.3,4.27 ; -0.3,4.27 -0.3,8.97 0.3,8.97 0.3,4.27 ; -0.3,4.27 0.3,4.27 ; 2.24,4.27 2.84,4.27 ; 2.24,4.27 2.24,8.97 2.84,8.97 2.84,4.27 ; 2.24,4.27 2.84,4.27 ; 4.78,4.27 5.38,4.27 ; 4.78,4.27 4.78,8.97 5.38,8.97 5.38,4.27 ; 4.78,4.27 5.38,4.27 ; 7.32,4.27 7.92,4.27 ; 7.32,4.27 7.32,8.97 7.92,8.97 7.92,4.27 ; 7.32,4.27 7.92,4.27 ; 9.86,4.27 10.46,4.27 ; 9.86,4.27 9.86,8.97 10.46,8.97 10.46,4.27 ; 9.86,4.27 10.46,4.27 ; 12.4,4.27 13,4.27 ; 12.4,4.27 12.4,8.97 13,8.97 13,4.27 ; 12.4,4.27 13,4.27 ; 14.94,4.27 15.54,4.27 ; 14.94,4.27 14.94,8.97 15.54,8.97 15.54,4.27 ; 14.94,4.27 15.54,4.27 ; -16.51,2.57 -16.51,4.27 16.51,4.27 16.51,2.57 -16.51,2.57
  text "1" at -17.272,-1.778 h1.02
  text "26" at 16.891,0.889 h1.02
3D body "COMATEL_391.0401.1.26.400.stp": height 5.57, standoff -4.3, extent -16.51,-1.57 16.51,10.27
3D body "v160-090.stp": height 0.02, standoff -1.65, extent -16.04,-2.07 -14.44,-0.47
3D body "v160-090.stp": height 0.02, standoff -1.65, extent -16.04,0.47 -14.44,2.07
3D body "v160-090.stp": height 0.02, standoff -1.65, extent -13.5,0.47 -11.9,2.07
3D body "v160-090.stp": height 0.02, standoff -1.65, extent -13.5,-2.07 -11.9,-0.47
3D body "v160-090.stp": height 0.02, standoff -1.65, extent -10.96,-2.07 -9.36,-0.47
3D body "v160-090.stp": height 0.02, standoff -1.65, extent -10.96,0.47 -9.36,2.07
3D body "v160-090.stp": height 0.02, standoff -1.65, extent -8.42,0.47 -6.82,2.07
3D body "v160-090.stp": height 0.02, standoff -1.65, extent -8.42,-2.07 -6.82,-0.47
3D body "v160-090.stp": height 0.02, standoff -1.65, extent -5.88,-2.07 -4.28,-0.47
3D body "v160-090.stp": height 0.02, standoff -1.65, extent -5.88,0.47 -4.28,2.07
3D body "v160-090.stp": height 0.02, standoff -1.65, extent -3.34,0.47 -1.74,2.07
3D body "v160-090.stp": height 0.02, standoff -1.65, extent -3.34,-2.07 -1.74,-0.47
3D body "v160-090.stp": height 0.02, standoff -1.65, extent -0.8,-2.07 0.8,-0.47
3D body "v160-090.stp": height 0.02, standoff -1.65, extent -0.8,0.47 0.8,2.07
3D body "v160-090.stp": height 0.02, standoff -1.65, extent 1.74,-2.07 3.34,-0.47
3D body "v160-090.stp": height 0.02, standoff -1.65, extent 1.74,0.47 3.34,2.07
3D body "v160-090.stp": height 0.02, standoff -1.65, extent 4.28,-2.07 5.88,-0.47
3D body "v160-090.stp": height 0.02, standoff -1.65, extent 4.28,0.47 5.88,2.07
3D body "v160-090.stp": height 0.02, standoff -1.65, extent 6.82,0.47 8.42,2.07
3D body "v160-090.stp": height 0.02, standoff -1.65, extent 6.82,-2.07 8.42,-0.47
3D body "v160-090.stp": height 0.02, standoff -1.65, extent 9.36,-2.07 10.96,-0.47
3D body "v160-090.stp": height 0.02, standoff -1.65, extent 9.36,0.47 10.96,2.07
3D body "v160-090.stp": height 0.02, standoff -1.65, extent 11.9,-2.07 13.5,-0.47
3D body "v160-090.stp": height 0.02, standoff -1.65, extent 11.9,0.47 13.5,2.07
3D body "v160-090.stp": height 0.02, standoff -1.65, extent 14.44,0.47 16.04,2.07
3D body "v160-090.stp": height 0.02, standoff -1.65, extent 14.44,-2.07 16.04,-0.47

## COMATEL_391.0401.1.34.400 [mm] "34 Contacts - Pitch 2.54mm - Dual Row Right Angle Strip Header - Insulator 1.7mm"
height 8
pads (34):
  round 1.6 hole 0.9: 1(-20.32,-1.27) 2(-20.32,1.27) 3(-17.78,-1.27) 4(-17.78,1.27) 5(-15.24,-1.27) 6(-15.24,1.27) 7(-12.7,-1.27) 8(-12.7,1.27) 9(-10.16,-1.27) 10(-10.16,1.27) 11(-7.62,-1.27) 12(-7.62,1.27) 13(-5.08,-1.27) 14(-5.08,1.27) 15(-2.54,-1.27) 16(-2.54,1.27) 17(0,-1.27) 18(0,1.27) 19(2.54,-1.27) 20(2.54,1.27) 21(5.08,-1.27) 22(5.08,1.27) 23(7.62,-1.27) 24(7.62,1.27) 25(10.16,-1.27) 26(10.16,1.27) 27(12.7,-1.27) 28(12.7,1.27) 29(15.24,-1.27) 30(15.24,1.27) 31(17.78,-1.27) 32(17.78,1.27) 33(20.32,-1.27) 34(20.32,1.27)
Top Overlay:
  circle w0.3: c-20.393,-3.048 r0.15
  lines w0.2: -20.62,4.27 -20.02,4.27 ; -20.62,4.27 -20.62,8.97 -20.02,8.97 -20.02,4.27 ; -20.62,4.27 -20.02,4.27 ; -20.62,4.27 -20.02,4.27 ; -20.62,4.27 -20.02,4.27 ; -18.08,4.27 -17.48,4.27 ; -18.08,4.27 -18.08,8.97 -17.48,8.97 -17.48,4.27 ; -18.08,4.27 -17.48,4.27 ; -18.08,4.27 -17.48,4.27 ; -18.08,4.27 -17.48,4.27 ; -15.54,4.27 -14.94,4.27 ; -15.54,4.27 -15.54,8.97 -14.94,8.97 -14.94,4.27 ; -15.54,4.27 -14.94,4.27 ; -15.54,4.27 -14.94,4.27 ; -15.54,4.27 -14.94,4.27 ; -13,4.27 -12.4,4.27 ; -13,4.27 -13,8.97 -12.4,8.97 -12.4,4.27 ; -13,4.27 -12.4,4.27 ; -13,4.27 -12.4,4.27 ; -13,4.27 -12.4,4.27 ; -10.46,4.27 -9.86,4.27 ; -10.46,4.27 -10.46,8.97 -9.86,8.97 -9.86,4.27 ; -10.46,4.27 -9.86,4.27 ; -10.46,4.27 -9.86,4.27 ; -10.46,4.27 -9.86,4.27 ; -7.92,4.27 -7.32,4.27 ; -7.92,4.27 -7.92,8.97 -7.32,8.97 -7.32,4.27 ; -7.92,4.27 -7.32,4.27 ; -7.92,4.27 -7.32,4.27 ; -7.92,4.27 -7.32,4.27 ; -5.38,4.27 -4.78,4.27 ; -5.38,4.27 -5.38,8.97 -4.78,8.97 -4.78,4.27 ; -5.38,4.27 -4.78,4.27 ; -5.38,4.27 -4.78,4.27 ; -5.38,4.27 -4.78,4.27 ; -2.84,4.27 -2.24,4.27 ; -2.84,4.27 -2.84,8.97 -2.24,8.97 -2.24,4.27 ; -2.84,4.27 -2.24,4.27 ; -2.84,4.27 -2.24,4.27 ; -2.84,4.27 -2.24,4.27 ; -0.3,4.27 0.3,4.27 ; -0.3,4.27 -0.3,8.97 0.3,8.97 0.3,4.27 ; -0.3,4.27 0.3,4.27 ; -0.3,4.27 0.3,4.27 ; -0.3,4.27 0.3,4.27 ; 2.24,4.27 2.84,4.27 ; 2.24,4.27 2.24,8.97 2.84,8.97 2.84,4.27 ; 2.24,4.27 2.84,4.27 ; 2.24,4.27 2.84,4.27 ; 2.24,4.27 2.84,4.27 ; 4.78,4.27 5.38,4.27 ; 4.78,4.27 4.78,8.97 5.38,8.97 5.38,4.27 ; 4.78,4.27 5.38,4.27 ; 4.78,4.27 5.38,4.27 ; 4.78,4.27 5.38,4.27 ; 7.32,4.27 7.92,4.27 ; 7.32,4.27 7.32,8.97 7.92,8.97 7.92,4.27 ; 7.32,4.27 7.92,4.27 ; 7.32,4.27 7.92,4.27 ; 7.32,4.27 7.92,4.27 ; 9.86,4.27 10.46,4.27 ; 9.86,4.27 9.86,8.97 10.46,8.97 10.46,4.27 ; 9.86,4.27 10.46,4.27 ; 9.86,4.27 10.46,4.27 ; 9.86,4.27 10.46,4.27 ; 12.4,4.27 13,4.27 ; 12.4,4.27 12.4,8.97 13,8.97 13,4.27 ; 12.4,4.27 13,4.27 ; 14.94,4.27 15.54,4.27 ; 14.94,4.27 14.94,8.97 15.54,8.97 15.54,4.27 ; 14.94,4.27 15.54,4.27 ; 17.48,4.27 18.08,4.27 ; 17.48,4.27 17.48,8.97 18.08,8.97 18.08,4.27 ; 17.48,4.27 18.08,4.27 ; 20.02,4.27 20.62,4.27 ; 20.02,4.27 20.02,8.97 20.62,8.97 20.62,4.27 ; 20.02,4.27 20.62,4.27 ; -21.59,2.57 -21.59,4.27 21.59,4.27 21.59,2.57 -21.59,2.57
  text "1" at -22.352,-1.778 h1.02
  text "34" at 21.971,0.889 h1.02
Mechanical 8:
  lines w0.1: -23.89,4.27 23.88,4.27 23.88,20.67 -23.89,20.67 -23.89,4.27
Mechanical 14:
  lines w0.1: -20.62,4.27 -20.02,4.27 ; -20.62,4.27 -20.62,8.97 -20.02,8.97 -20.02,4.27 ; -20.62,4.27 -20.02,4.27 ; -20.62,4.27 -20.02,4.27 ; -20.62,4.27 -20.02,4.27 ; -18.08,4.27 -17.48,4.27 ; -18.08,4.27 -18.08,8.97 -17.48,8.97 -17.48,4.27 ; -18.08,4.27 -17.48,4.27 ; -18.08,4.27 -17.48,4.27 ; -18.08,4.27 -17.48,4.27 ; -15.54,4.27 -14.94,4.27 ; -15.54,4.27 -15.54,8.97 -14.94,8.97 -14.94,4.27 ; -15.54,4.27 -14.94,4.27 ; -15.54,4.27 -14.94,4.27 ; -15.54,4.27 -14.94,4.27 ; -13,4.27 -12.4,4.27 ; -13,4.27 -13,8.97 -12.4,8.97 -12.4,4.27 ; -13,4.27 -12.4,4.27 ; -13,4.27 -12.4,4.27 ; -13,4.27 -12.4,4.27 ; -10.46,4.27 -9.86,4.27 ; -10.46,4.27 -10.46,8.97 -9.86,8.97 -9.86,4.27 ; -10.46,4.27 -9.86,4.27 ; -10.46,4.27 -9.86,4.27 ; -10.46,4.27 -9.86,4.27 ; -7.92,4.27 -7.32,4.27 ; -7.92,4.27 -7.92,8.97 -7.32,8.97 -7.32,4.27 ; -7.92,4.27 -7.32,4.27 ; -7.92,4.27 -7.32,4.27 ; -7.92,4.27 -7.32,4.27 ; -5.38,4.27 -4.78,4.27 ; -5.38,4.27 -5.38,8.97 -4.78,8.97 -4.78,4.27 ; -5.38,4.27 -4.78,4.27 ; -5.38,4.27 -4.78,4.27 ; -5.38,4.27 -4.78,4.27 ; -2.84,4.27 -2.24,4.27 ; -2.84,4.27 -2.84,8.97 -2.24,8.97 -2.24,4.27 ; -2.84,4.27 -2.24,4.27 ; -2.84,4.27 -2.24,4.27 ; -2.84,4.27 -2.24,4.27 ; -0.3,4.27 0.3,4.27 ; -0.3,4.27 -0.3,8.97 0.3,8.97 0.3,4.27 ; -0.3,4.27 0.3,4.27 ; -0.3,4.27 0.3,4.27 ; -0.3,4.27 0.3,4.27 ; 2.24,4.27 2.84,4.27 ; 2.24,4.27 2.24,8.97 2.84,8.97 2.84,4.27 ; 2.24,4.27 2.84,4.27 ; 2.24,4.27 2.84,4.27 ; 2.24,4.27 2.84,4.27 ; 4.78,4.27 5.38,4.27 ; 4.78,4.27 4.78,8.97 5.38,8.97 5.38,4.27 ; 4.78,4.27 5.38,4.27 ; 4.78,4.27 5.38,4.27 ; 4.78,4.27 5.38,4.27 ; 7.32,4.27 7.92,4.27 ; 7.32,4.27 7.32,8.97 7.92,8.97 7.92,4.27 ; 7.32,4.27 7.92,4.27 ; 7.32,4.27 7.92,4.27 ; 7.32,4.27 7.92,4.27 ; 9.86,4.27 10.46,4.27 ; 9.86,4.27 9.86,8.97 10.46,8.97 10.46,4.27 ; 9.86,4.27 10.46,4.27 ; 9.86,4.27 10.46,4.27 ; 9.86,4.27 10.46,4.27 ; 12.4,4.27 13,4.27 ; 12.4,4.27 12.4,8.97 13,8.97 13,4.27 ; 12.4,4.27 13,4.27 ; 14.94,4.27 15.54,4.27 ; 14.94,4.27 14.94,8.97 15.54,8.97 15.54,4.27 ; 14.94,4.27 15.54,4.27 ; 17.48,4.27 18.08,4.27 ; 17.48,4.27 17.48,8.97 18.08,8.97 18.08,4.27 ; 17.48,4.27 18.08,4.27 ; 20.02,4.27 20.62,4.27 ; 20.02,4.27 20.02,8.97 20.62,8.97 20.62,4.27 ; 20.02,4.27 20.62,4.27 ; -21.59,2.57 21.59,2.57 21.59,4.27 -21.59,4.27 -21.59,2.57
  text "1" at -22.352,-1.778 h1.02
  text "34" at 21.971,0.889 h1.02
3D body "v160-090.stp": height 0.02, standoff -1.65, extent 19.52,0.47 21.12,2.07
3D body "v160-090.stp": height 0.02, standoff -1.65, extent 19.52,-2.07 21.12,-0.47
3D body "v160-090.stp": height 0.02, standoff -1.65, extent 16.98,0.47 18.58,2.07
3D body "v160-090.stp": height 0.02, standoff -1.65, extent 16.98,-2.07 18.58,-0.47
3D body "v160-090.stp": height 0.02, standoff -1.65, extent 14.44,0.47 16.04,2.07
3D body "v160-090.stp": height 0.02, standoff -1.65, extent 14.44,-2.07 16.04,-0.47
3D body "v160-090.stp": height 0.02, standoff -1.65, extent 11.9,0.47 13.5,2.07
3D body "v160-090.stp": height 0.02, standoff -1.65, extent 11.9,-2.07 13.5,-0.47
3D body "v160-090.stp": height 0.02, standoff -1.65, extent 9.36,0.47 10.96,2.07
3D body "v160-090.stp": height 0.02, standoff -1.65, extent 9.36,-2.07 10.96,-0.47
3D body "v160-090.stp": height 0.02, standoff -1.65, extent 6.82,0.47 8.42,2.07
3D body "v160-090.stp": height 0.02, standoff -1.65, extent 6.82,-2.07 8.42,-0.47
3D body "v160-090.stp": height 0.02, standoff -1.65, extent 4.28,0.47 5.88,2.07
3D body "v160-090.stp": height 0.02, standoff -1.65, extent 4.28,-2.07 5.88,-0.47
3D body "v160-090.stp": height 0.02, standoff -1.65, extent 1.74,0.47 3.34,2.07
3D body "v160-090.stp": height 0.02, standoff -1.65, extent 1.74,-2.07 3.34,-0.47
3D body "v160-090.stp": height 0.02, standoff -1.65, extent -0.8,0.47 0.8,2.07
3D body "v160-090.stp": height 0.02, standoff -1.65, extent -0.8,-2.07 0.8,-0.47
3D body "v160-090.stp": height 0.02, standoff -1.65, extent -3.34,-2.07 -1.74,-0.47
3D body "v160-090.stp": height 0.02, standoff -1.65, extent -3.34,0.47 -1.74,2.07
3D body "v160-090.stp": height 0.02, standoff -1.65, extent -5.88,0.47 -4.28,2.07
3D body "v160-090.stp": height 0.02, standoff -1.65, extent -5.88,-2.07 -4.28,-0.47
3D body "v160-090.stp": height 0.02, standoff -1.65, extent -8.42,0.47 -6.82,2.07
3D body "v160-090.stp": height 0.02, standoff -1.65, extent -8.42,-2.07 -6.82,-0.47
3D body "v160-090.stp": height 0.02, standoff -1.65, extent -10.96,0.47 -9.36,2.07
3D body "v160-090.stp": height 0.02, standoff -1.65, extent -13.5,0.47 -11.9,2.07
3D body "v160-090.stp": height 0.02, standoff -1.65, extent -16.04,0.47 -14.44,2.07
3D body "v160-090.stp": height 0.02, standoff -1.65, extent -18.58,0.47 -16.98,2.07
3D body "v160-090.stp": height 0.02, standoff -1.65, extent -10.96,-2.07 -9.36,-0.47
3D body "v160-090.stp": height 0.02, standoff -1.65, extent -13.5,-2.07 -11.9,-0.47
3D body "v160-090.stp": height 0.02, standoff -1.65, extent -16.04,-2.07 -14.44,-0.47
3D body "v160-090.stp": height 0.02, standoff -1.65, extent -18.58,-2.07 -16.98,-0.47
3D body "v160-090.stp": height 0.02, standoff -1.65, extent -21.12,-2.07 -19.52,-0.47
3D body "v160-090.stp": height 0.02, standoff -1.65, extent -21.12,0.47 -19.52,2.07
3D body "COMATEL_391.0401.1.34.400.stp": height 5.57, standoff -4.3, extent -21.59,-1.57 21.59,10.27